# Altium footprint library NEW.PcbLib: 53 footprints (part 2 of 4)
Each footprint in its own frame and in the unit in brackets; x right, y up, seen from the top. Pads: shape width x height; smd on the part's side, far side on the other; paste and mask are expansions set on the pad; w line width, h text height; cw(c..) or ccw(c..) is an arc to the next point about the centre after c.
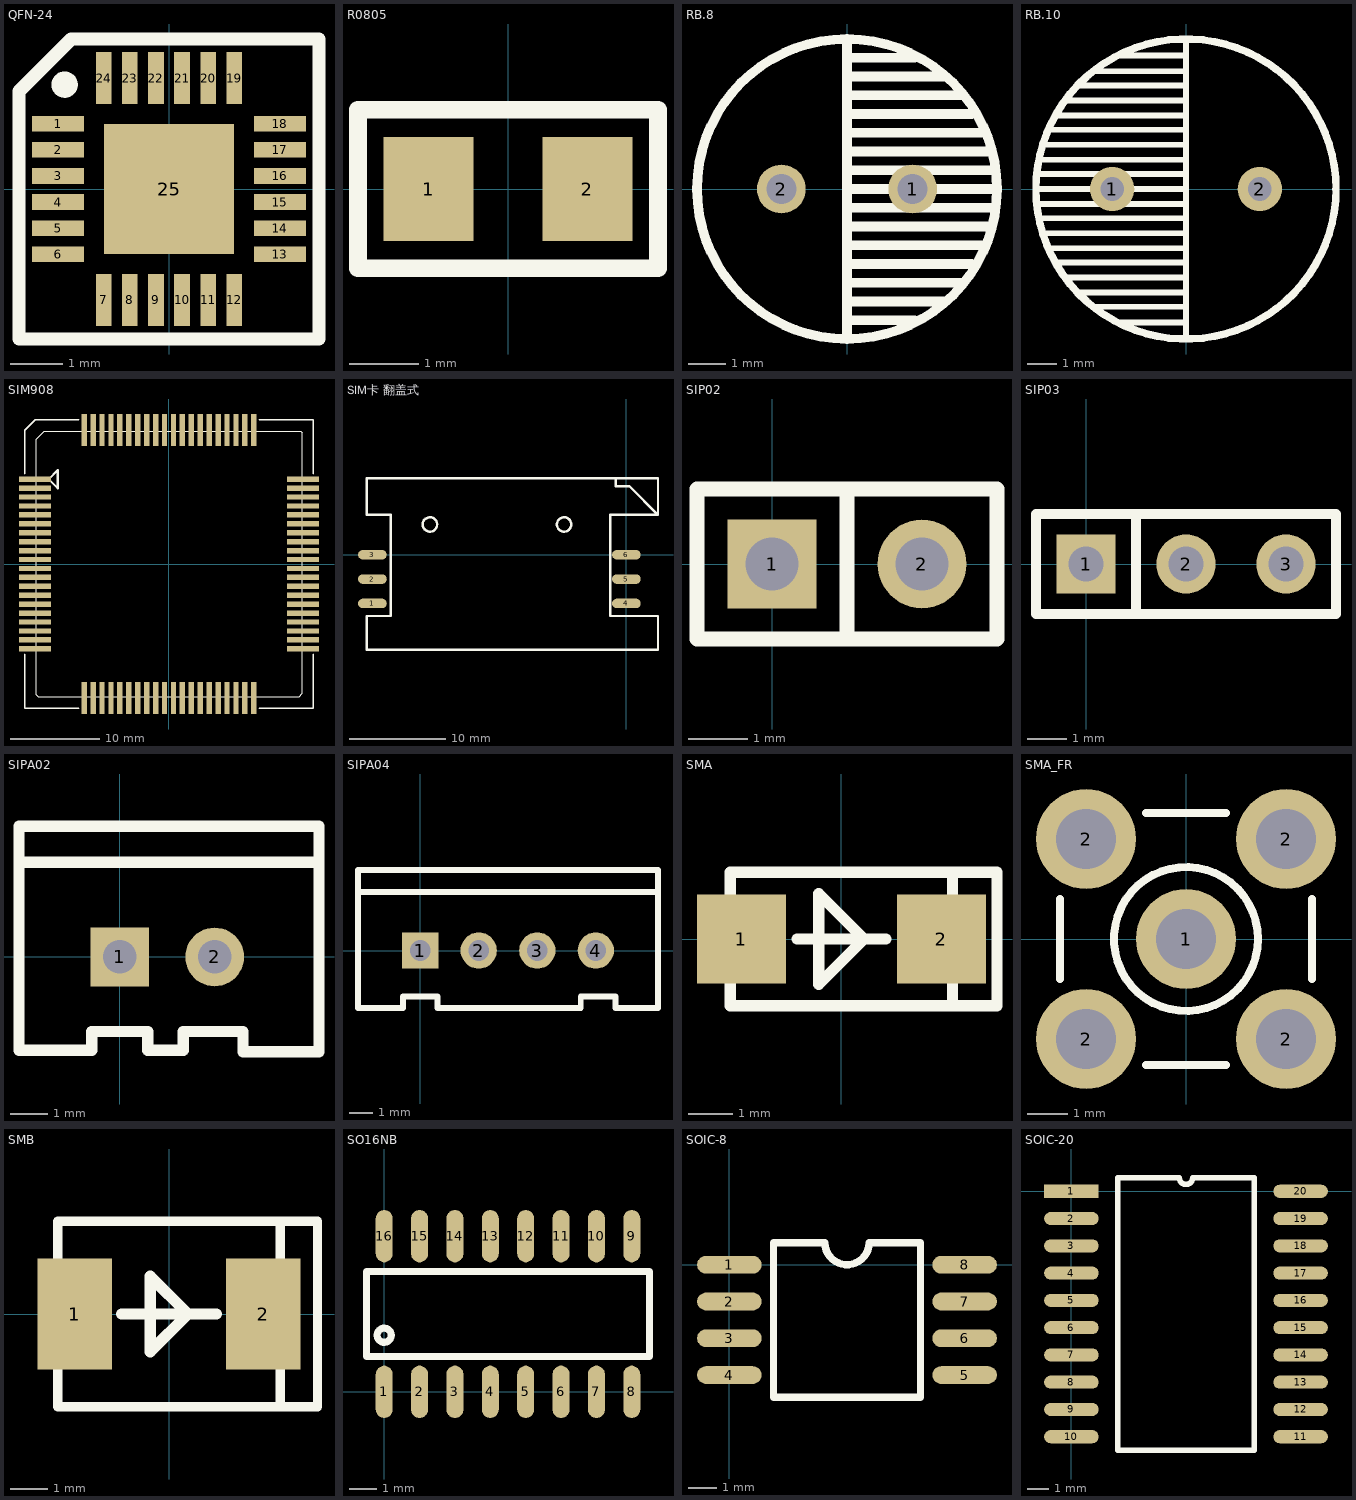
[diagram p1: the footprints below, top view; thin cyan lines are the x and y axes]

## QFN-24 [mm]
pads (25):
  rect 1x0.3 smd: 1(-2.125,1.25) 2(-2.125,0.75) 3(-2.125,0.25) 4(-2.125,-0.25) 5(-2.125,-0.75) 6(-2.125,-1.25) 13(2.125,-1.25) 14(2.125,-0.75) 15(2.125,-0.25) 16(2.125,0.25) 17(2.125,0.75) 18(2.125,1.25)
  rect 0.3x1 smd: 7(-1.25,-2.125) 8(-0.75,-2.125) 9(-0.25,-2.125) 10(0.25,-2.125) 11(0.75,-2.125) 12(1.25,-2.125) 19(1.25,2.125) 20(0.75,2.125) 21(0.25,2.125) 22(-0.25,2.125) 23(-0.75,2.125) 24(-1.25,2.125)
  rect 2.5x2.5 smd: 25(0,0)
Top Overlay:
  circle w0.254: c-2,2 r0.125
  lines w0.254: -2.875,-2.875 2.875,-2.875 2.875,2.875 -1.25,2.875 -1.875,2.875 -2.875,1.875 -2.875,1.25 -2.875,-2.875
3D body: height 0.9, standoff 0, extent -2.002,-2.002 2.002,2.002

## R0805 [mm]
height 0.5
pads (2):
  rect 1.3x1.5 smd: 1(-1.143,0) 2(1.143,0)
Top Overlay:
  lines w0.254: -2.159,-1.143 2.159,-1.143 2.159,0.508 2.159,1.143 -2.159,1.143 -2.159,0.635 -2.159,-1.143
3D body: height 0.55, standoff 0, extent -1,-0.63 1,0.63

## RB.8 [mm] "8*12  470uF/25V"
height 12
pads (2):
  round 1.3 / inner round 1.3 / far side round 1.5 hole 0.8: 1(1.75,0) 2(-1.75,0)
Top Overlay:
  circle w0.254: c0,0 r4
  lines w0.254: 0,-3.9 0,3.9 ; 0,-3.5 1.802,-3.5 ; 0,-3 2.564,-3 ; 0,-2.5 3.072,-2.5 ; 0,-2 3.326,-2 ; 0,-1.5 3.58,-1.5 ; 0,-1 3.834,-1 ; 0,-0.5 3.834,-0.5 ; 0,0 4,0 ; 0,0.5 3.834,0.5 ; 0,1 3.834,1 ; 0,1.5 3.58,1.5 ; 0,2 3.326,2 ; 0,2.5 3.072,2.5 ; 0,3 2.564,3 ; 0,3.5 1.802,3.5
3D body: height 11.83, standoff -3.68, extent -4.025,-4.025 4.026,4.026

## RB.10 [mm] "10*17  470uF/35V 1000uF/25V"
height 17
pads (2):
  round 1.5 / inner round 1.5 / far side round 1.8 hole 0.8: 1(-2.5,0) 2(2.5,0)
Top Overlay:
  circle w0.254: c0,0 r5.08
  lines w0.2: -5.08,0 0,0 ; -5.055,-0.508 0,-0.508 ; -5.055,0.508 0,0.508 ; -4.953,-0.991 0,-0.991 ; -4.953,0.991 0,0.991 ; -4.826,-1.499 0,-1.499 ; -4.826,1.499 0,1.499 ; -4.648,-2.007 0,-2.007 ; -4.648,2.007 0,2.007 ; -4.394,-2.489 0,-2.489 ; -4.394,2.489 0,2.489 ; -4.089,-2.997 0,-2.997 ; -4.089,2.997 0,2.997 ; -3.683,-3.505 0,-3.505 ; -3.683,3.505 0,3.505 ; -3.073,-3.988 0,-3.988 ; -3.073,3.988 0,3.988 ; -2.286,-4.521 0,-4.521 ; -2.286,4.521 0,4.521 ; 0,-5.08 0,5.08
3D body: height 16.33, standoff -3.94, extent -5.026,-5.026 5.025,5.025

## SIM908 [mm]
height 3.2
pads (80):
  rect 3.6x0.6 smd: 1(-15,9.5) 2(-15,8.5) 3(-15,7.5) 4(-15,6.5) 5(-15,5.5) 6(-15,4.5) 7(-15,3.5) 8(-15,2.5) 9(-15,1.5) 10(-15,0.5) 11(-15,-0.5) 12(-15,-1.5) 13(-15,-2.5) 14(-15,-3.5) 15(-15,-4.5) 16(-15,-5.5) 17(-15,-6.5) 18(-15,-7.5) 19(-15,-8.5) 20(-15,-9.5) 41(15,-9.5) 42(15,-8.5) 43(15,-7.5) 44(15,-6.5) 45(15,-5.5) 46(15,-4.5) 47(15,-3.5) 48(15,-2.5) 49(15,-1.5) 50(15,-0.5) 51(15,0.5) 52(15,1.5) 53(15,2.5) 54(15,3.5) 55(15,4.5) 56(15,5.5) 57(15,6.5) 58(15,7.5) 59(15,8.5) 60(15,9.5)
  rect 0.6x3.6 smd: 21(-9.5,-15) 22(-8.5,-15) 23(-7.5,-15) 24(-6.5,-15) 25(-5.5,-15) 26(-4.5,-15) 27(-3.5,-15) 28(-2.5,-15) 29(-1.5,-15) 30(-0.5,-15) 31(0.5,-15) 32(1.5,-15) 33(2.5,-15) 34(3.5,-15) 35(4.5,-15) 36(5.5,-15) 37(6.5,-15) 38(7.5,-15) 39(8.5,-15) 40(9.5,-15) 61(9.5,15) 62(8.5,15) 63(7.5,15) 64(6.5,15) 65(5.5,15) 66(4.5,15) 67(3.5,15) 68(2.5,15) 69(1.5,15) 70(0.5,15) 71(-0.5,15) 72(-1.5,15) 73(-2.5,15) 74(-3.5,15) 75(-4.5,15) 76(-5.5,15) 77(-6.5,15) 78(-7.5,15) 79(-8.5,15) 80(-9.5,15)
Top Overlay:
  lines w0.127: -14.848,-14.655 -14.644,-14.859 7.301,-14.859 14.566,-14.859 14.947,-14.478 14.947,9.348 14.947,14.682 14.743,14.885 13.499,14.885 -13.959,14.885 -14.136,14.707 -14.848,13.996 -14.848,10.084 -14.848,-14.655
  lines w0.2: -16.15,-10.1 -16.15,-16.15 -10.1,-16.15 ; -16.15,10.1 -16.15,15 -15,16.15 -10.1,16.15 ; 10.1,-16.15 16.15,-16.15 16.15,-10.1 ; 10.1,16.15 16.15,16.15 16.15,10.1
  lines w0.254: -13.476,9.5 -12.46,10.516 -12.46,8.484 -13.476,9.5
3D body: height 3.19, standoff -0.01, extent -15,-15 15,15

## SIM卡 翻盖式 [mm]
height 2
pads (6):
  oval 3x1 smd: 1(-26.5,-5.08) 2(-26.5,-2.54) 3(-26.5,0) 4(0,-5.08) 5(0,-2.54) 6(0,0)
Top Overlay:
  circle w0.254: c-6.5,3.16 r0.75
  circle w0.254: c-20.5,3.16 r0.75
  lines w0.254: -1.1,7.96 -1.1,7.16 0.3,7.16 3.3,4.16 ; 3.3,4.16 -1.7,4.16 -1.7,-6.39 3.3,-6.39 3.3,-9.89 -27.1,-9.89 -27.1,-6.39 -24.6,-6.39 -24.6,4.16 -27.1,4.16 -27.1,7.96 -2.451,7.96 3.3,7.96 3.3,4.16
3D body: height 2.6, standoff -0.7, extent -26.48,-9.85 3.16,7.35

## SIP02 [mm]
pads (2):
  rect 1.5x1.5 hole 0.9: 1(0,0)
  round 1.5 hole 0.9: 2(2.54,0)
Top Overlay:
  lines w0.254: 1.27,-1.27 1.27,1.27 ; -1.27,-1.27 3.81,-1.27 3.81,1.27 -1.27,1.27 -1.27,-1.27
3D body: height 8.54, standoff -3, extent -1.27,-1.27 3.81,1.27

## SIP03 [mm]
pads (3):
  rect 1.5x1.5 hole 0.9: 1(0,0)
  round 1.5 hole 0.9: 2(2.54,0) 3(5.08,0)
Top Overlay:
  lines w0.254: 1.27,-1.27 1.27,1.27 ; -1.27,-1.27 6.35,-1.27 6.35,1.27 -1.27,1.27 -1.27,-1.27
3D body: height 8.54, standoff -3, extent -1.27,-1.27 6.35,1.27

## SIPA02 [mil]
pads (2):
  rect 62x62 hole 35.43: 1(0,0)
  round 62 hole 35.43: 2(100,0)
Top Overlay:
  lines w11.81: -106.3,-98.42 -29.53,-98.42 -29.53,-78.74 29.53,-78.74 29.53,-98.42 66.93,-98.42 ; 70.87,-78.74 66.93,-82.68 66.93,-86.61 66.93,-98.42 ; 210,-100 129.92,-100 129.92,-78.74 66.93,-78.74 66.93,-98.42
  lines w12: -106.3,-98.42 -106.3,137.79 210,137.79 ; -106.3,100 204.49,100 ; 210,-100 210,136.22
3D body: height 279.53, standoff -129.92, extent -95.66,-92.51 195.68,133.87

## SIPA04 [mil]
pads (4):
  rect 62x62 hole 35.43: 1(0,0)
  round 62 hole 35.43: 2(100,0) 3(200,0) 4(300,0)
Top Overlay:
  lines w10: -102.48,100 -6.3,100 404.72,100 ; 404.72,137.79 -6.3,137.79 -106.3,137.79 -106.3,-98.42 -29.53,-98.42 -29.53,-78.74 29.53,-78.74 29.53,-98.42 174.41,-98.42 274.41,-98.42 274.41,-78.74 333.46,-78.74 333.46,-98.42 406.3,-98.42 406.3,137.79
3D body: height 279.53, standoff -129.92, extent -94.09,-92.36 394.1,134.02

## SMA [mm]
height 2
pads (2):
  rect 2x2 smd: 1(-2.25,0) 2(2.25,0)
Top Overlay:
  lines w0.254: -2.5,-1 -2.5,-1.5 2.5,-1.5 ; -2.5,1 -2.5,1.5 2.5,1.5 ; -1,0 1,0 ; 2.5,-1 2.5,-1.5 ; 2.5,1 2.5,1.5 ; 2.5,-1.5 3.5,-1.5 3.5,1.5 2.5,1.5 ; -0.508,-1.016 0.508,0 -0.508,1.016 -0.508,-1.016
3D body: height 2.15, standoff -0.05, extent -2.5,-1.35 2.5,1.35

## SMA_FR [mm]
height 8
pads (5):
  round 2.5 hole 1.5: 1(0,0) 2(-2.5,-2.5) 2(-2.5,2.5) 2(2.5,-2.5) 2(2.5,2.5)
Top Overlay:
  circle w0.2: c0,0 r1.8
  lines w0.2: -3.15,-1 -3.15,1 ; -1,-3.15 1,-3.15 ; -1,3.15 1,3.15 ; 3.15,-1 3.15,1
Mechanical 1:
  circle w0.025: c0,0 r1.8
  circle w0.025: c0,0 r1.05
  circle w0.025: c0,0 r0.2
3D body: height 10.26, standoff -3.84, extent -3.5,-3.5 3.5,11.6

## SMB [mm]
height 2
pads (2):
  rect 2x3 smd: 1(-2.54,0) 2(2.54,0)
Top Overlay:
  lines w0.254: -3,-1.5 -3,-2.5 3,-2.5 ; -3,1.5 -3,2.5 3,2.5 ; 3,-1.5 3,-2.5 ; 3,1.5 3,2.5 ; 3,-2.5 4,-2.5 4,2.5 3,2.5
  lines w0.305: -1.27,0 1.27,0 ; -0.508,-1.016 0.508,0 -0.508,1.016 -0.508,-1.016
3D body: height 2.2, standoff -0.05, extent -2.65,-1.85 2.65,1.85

## SO16NB [mil]
pads (16):
  oval 24x74 smd: 1(0,0) 2(50,0) 3(100,0) 4(150,0) 5(200,0) 6(250,0) 7(300,0) 8(350,0) 9(350,220) 10(300,220) 11(250,220) 12(200,220) 13(150,220) 14(100,220) 15(50,220) 16(0,220)
Top Overlay:
  circle w10: c0,80 r10
  lines w10: -25,50 -25,170 375,170 375,50 -25,50
3D body: height 68.9, standoff 0, extent -18.83,-5 367,223.35

## SOIC-8 [mil]
pads (8):
  oval 88x24 smd: 1(0,0) 2(0,-50) 3(0,-100) 4(0,-150) 5(320,-150) 6(320,-100) 7(320,-50) 8(320,0)
Top Overlay:
  lines w10: 60,-180 60,30 130,30 ccw(c160,30) 190,30 260,30 260,-180 60,-180
3D body: height 90.55, standoff -0.78, extent -5.2,-180.9 325.21,30.91

## SOIC-20 [mil]
height 39.37
pads (20):
  rect 100x24 smd: 1(0,0)
  oval 100x24 smd: 2(0,-50) 3(0,-100) 4(0,-150) 5(0,-200) 6(0,-250) 7(0,-300) 8(0,-350) 9(0,-400) 10(0,-450) 11(420,-450) 12(420,-400) 13(420,-350) 14(420,-300) 15(420,-250) 16(420,-200) 17(420,-150) 18(420,-100) 19(420,-50) 20(420,0)
Top Overlay:
  lines w10: 85,-475 335,-475 335,25 222.5,25 cw(c210,25) 197.5,25 85,25 85,-475
3D body: height 101.38, standoff -0.98, extent 1.34,-480.9 418.66,30.91